# Altium footprint library mechanical.PcbLib: 44 footprints (part 3 of 3)
Each footprint in its own frame and in the unit in brackets; x right, y up, seen from the top. Pads: shape width x height; smd on the part's side, far side on the other; paste and mask are expansions set on the pad; w line width, h text height; cw(c..) or ccw(c..) is an arc to the next point about the centre after c.
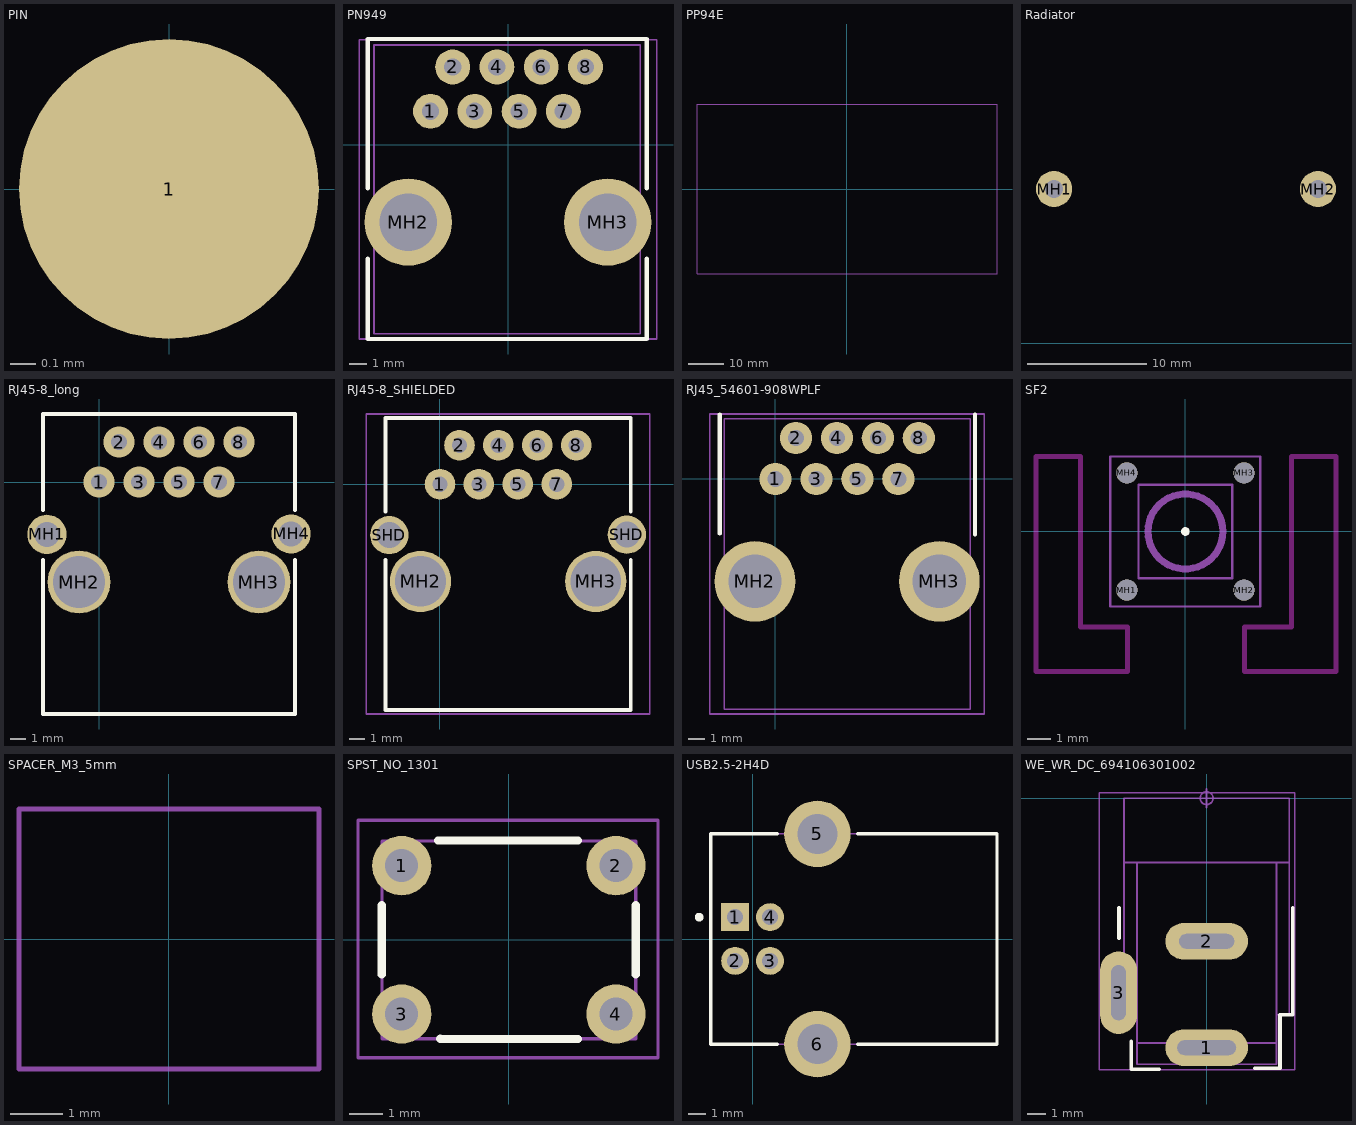
[diagram p2: the footprints below, top view; thin cyan lines are the x and y axes]

## PIN [mm] "Test Pad"
pads (1):
  round 1.2 smd: 1(0,0)

## PN949 [mm]
height 16.3
pads (10):
  round 2 hole 1: 1(-4.445,1.905) 2(-3.175,4.445) 3(-1.905,1.905) 4(-0.635,4.445) 5(0.635,1.905) 6(1.905,4.445) 7(3.175,1.905) 8(4.445,4.445)
  round 5 hole 3.3 unplated: MH2(-5.715,-4.445) MH3(5.715,-4.445)
Top Overlay:
  lines w0.254: -8.046,-6.55 -8.046,-11.15 7.956,-11.15 7.956,-6.55 ; -8.046,-2.497 -8.046,6.05 7.956,6.05 7.956,-2.497
Mechanical 13:
  lines w0.1: -7.68,-10.85 -7.68,5.71 7.58,5.71 7.58,-10.85 -7.68,-10.85
  text ".Designator" at -7.57,6.055 h0.5
  text ".Value" at -0.975,-0.2 h0.5
Mechanical 15:
  lines w0.1: -8.525,-11.15 -8.525,6.01 8.525,6.01 8.525,-11.15 -8.525,-11.15
3D body "keystone-PN949.STEP": height 16.49, standoff -3, extent -7.68,-10.85 7.58,5.71

## PP94E [mm]
height 25.7
Mechanical 1:
  lines w0.1: -42.75,-24.15 -42.75,24.15 42.75,24.15 42.75,-24.15 -42.75,-24.15
3D body "Tapa PP94 E.STEP": height 24.2, standoff -1.9, extent -42.75,-24.15 42.75,24.15

## Radiator [mm] "RAD-DY-GF/3"
height 15
pads (2):
  round 3.048 hole 1.5: MH1(3.9,13) MH2(26.1,13)

## RJ45-8_long [mm]
pads (12):
  round 2 hole 1: 1(0,0) 2(1.27,2.54) 3(2.54,0) 4(3.81,2.54) 5(5.08,0) 6(6.35,2.54) 7(7.62,0) 8(8.89,2.54)
  round 2.5 hole 1.6: MH1(-3.305,-3.325) MH4(12.195,-3.3)
  round 4 hole 3.3: MH2(-1.27,-6.35) MH3(10.16,-6.35)
Top Overlay:
  lines w0.254: -3.556,-4.953 -3.556,-14.732 12.446,-14.732 12.446,-4.953 ; -3.556,-1.778 -3.556,4.318 12.446,4.318 12.446,-1.778
3D body "User Library-FRJAE-468.step": height 13.98, standoff -3.68, extent -3.255,-14.542 12.145,4.128

## RJ45-8_SHIELDED [mm]
height 11.7
pads (12):
  round 2 hole 1: 1(0,0) 2(1.27,2.54) 3(2.54,0) 4(3.81,2.54) 5(5.08,0) 6(6.35,2.54) 7(7.62,0) 8(8.89,2.54)
  round 4 hole 3.3: MH2(-1.27,-6.35) MH3(10.16,-6.35)
  round 2.5 hole 1.7: SHD(-3.305,-3.325) SHD(12.195,-3.3)
Top Overlay:
  lines w0.254: -3.556,-4.953 -3.556,-14.732 12.446,-14.732 12.446,-4.953 ; -3.556,-1.778 -3.556,4.318 12.446,4.318 12.446,-1.778
Mechanical 15:
  lines w0.1: -4.825,-15 13.7,-15 13.7,4.575 -4.825,4.575 -4.825,-15
3D body "User Library-FRJAE-468.step": height 13.98, standoff -3.68, extent -3.255,-14.542 12.145,4.128

## RJ45_54601-908WPLF [mm]
height 11.5
pads (10):
  round 2 hole 1: 1(0,0) 2(1.27,2.54) 3(2.54,0) 4(3.81,2.54) 5(5.08,0) 6(6.35,2.54) 7(7.62,0) 8(8.89,2.54)
  round 5 hole 3.3 unplated: MH2(-1.27,-6.35) MH3(10.16,-6.35)
Top Overlay:
  lines w0.254: -3.45,-3.375 -3.45,4 ; 12.375,-3.45 12.375,4
Mechanical 13:
  lines w0.1: -3.165,-14.275 -3.165,3.725 12.075,3.725 12.075,-14.275 -3.165,-14.275
  text ".Value" at 3.75,-3.95 h0.5
  text ".Designator" at -3.019,4.018 h0.5
Mechanical 15:
  lines w0.1: -4.075,-14.575 12.95,-14.575 12.95,4.025 -4.075,4.025 -4.075,-14.575
3D body "s54601-908wplf.stp": height 12, standoff -3.25, extent -3.165,-14.275 12.075,3.725

## SF2 [mm]
height 2
pads (4):
  round 0.9 hole 0.9 unplated: MH1(-2.5,-2.5) MH2(2.5,-2.5) MH3(2.5,2.5) MH4(-2.5,2.5)
Top Overlay:
  circle w0.254: c0,0 r0.056
Keep-Out Layer:
  lines w0.2: -6.375,-5.975 -6.375,3.2 -4.475,3.2 -4.475,-4.075 -2.475,-4.075 -2.475,-5.975 -6.375,-5.975 ; 2.525,-5.975 6.425,-5.975 6.425,3.2 4.525,3.2 4.525,-4.075 2.525,-4.075 2.525,-5.975
Mechanical 13:
  circle w0.3: c0,0 r1.6
  lines w0.1: -3.2,-3.2 3.2,-3.2 3.2,3.2 -3.2,3.2 -3.2,-3.2 ; -2,-2 -2,0 -2,2 0,2 2,2 2,0 2,-2 0,-2 -2,-2
  text ".Designator" at -1.82,3.573 h0.5
  text ".Value" at -0.975,-3.925 h0.5
3D body "SF2.STEP": height 2.03, standoff -1.5, extent -3.2,-3.2 3.2,3.2

## SPACER_M3_5mm [mm]
height 5
Mechanical 1:
  lines w0.1: -2.887,-2.5 -2.887,2.5 2.887,2.5 2.887,-2.5 -2.887,-2.5
3D body "Spacer_M3_5mm.step": height 5, standoff -8, extent -2.887,-2.5 2.887,2.5

## SPST_NO_1301 [mm] "Micro Switch case 1301"
height 5
pads (4):
  round 1.8 hole 1: 1(-3.25,2.25) 2(3.25,2.25) 3(-3.25,-2.25) 4(3.25,-2.25)
Top Overlay:
  lines w0.254: -3.85,-1.05 -3.85,1.05 ; -2.15,3.012 2.1,3.012 ; -2.075,-3 2.1,-3.008 ; 3.85,-1.05 3.85,1.05
Mechanical 13:
  lines w0.1: -3.85,-3 -3.85,3 3.85,3 3.85,-3 -3.85,-3
  text ".Comment" at -1.65,-0.15 h0.5
  text ".Designator" at -3.875,3.325 h0.5
Mechanical 15:
  lines w0.1: -4.575,-3.575 -4.575,3.625 4.525,3.625 4.525,-3.575 -4.575,-3.575
3D body "19929.stp": height 4.3, standoff -3.5, extent -3.85,-3 3.85,3

## USB2.5-2H4D [mm] "Connector; USB1.1, Type B, Thru-Hole; 4 Position; Right Angle"
height 11.1
pads (6):
  rect 1.6x1.6 hole 0.92: 1(-1,1.25)
  round 1.6 hole 0.92: 2(-1,-1.25) 3(1,-1.25) 4(1,1.25)
  round 3.8 hole 2.3: 5(3.71,6.02) 6(3.71,-6.02)
Top Overlay:
  circle w0.25: c-3.06,1.25 r0.125
  lines w0.2: 1.41,-6.02 -2.41,-6.02 -2.41,6.02 1.41,6.02 ; 6.01,-6.02 13.99,-6.02 13.99,6.02 6.01,6.02
Mechanical 13:
  lines w0.1: -2.41,-6.02 13.99,-6.02 13.99,6.02 -2.41,6.02 -2.41,-6.02
3D body: height 11.1, standoff 0, extent -2.41,-6.02 13.99,6.02

## WE_WR_DC_694106301002 [mm]
height 11
pads (3):
  oval 4.5x2 hole 0.8 slot 3.2 at 0 deg: 1(0,-13.6)
  oval 4.5x2 hole 0.8 slot 3 at 0 deg: 2(0,-7.8)
  oval 2x4.5 hole 0.8 slot 3 at 90 deg: 3(-4.8,-10.6)
Top Overlay:
  lines w0.2: -4.775,-7.625 -4.775,-5.975 ; -4.1,-13.25 -4.1,-14.775 -2.6,-14.775 ; 2.625,-14.725 4,-14.725 4,-11.8 4.7,-11.8 4.7,-5.975
Mechanical 13:
  lines w0.1: -4.5,-9.3 -4.9,-9.3 -4.9,-11.8 -4.5,-11.8 ; -4.5,-3.5 4.5,-3.5 ; -3.8,-13.35 -1.25,-13.35 ; -3.8,-11.8 -4.5,-11.8 ; -3.8,-3.5 -3.8,-14.5 -1.25,-14.5 -1.25,-13.35 ; -1.25,-14 1.25,-14 ; 3.8,-13.35 1.25,-13.35 ; 3.8,-11.8 4.5,-11.8 4.5,0 0,0 -4.5,0 -4.5,-11.8 ; 3.8,-3.55 3.8,-14.5 1.25,-14.5 1.25,-13.35 ; -1.25,-13.35 1.25,-13.35
  text ".Comment" at -1.9,-3.2 h0.5
  text ".Designator" at -4.5,0.2 h0.5
Mechanical 15:
  circle w0.1: c0,0 r0.35
  lines w0.1: -0.5,0 0.5,0 ; 0,-0.5 0,0.5 ; -5.85,-14.8 4.8,-14.8 4.8,0.3 -5.85,0.3 -5.85,-14.8
3D body "694106301002.stp": height 10.75, standoff -3.75, extent -4.9,-14.5 4.5,0